# Altium schematic symbol library Minh_Lib.SchLib: 619 symbols (part 2 of 4) (continued)
## CDRH104RNP-180NC
designator H?  Supplier Part Number 1: 851-CDRH104RNP-180NC
Ind Power Shielded Wirewound 18uH 30% 100KHz Ferrite 2.6A Carrier T/R; Manufacturer: Sumida; Manufacturer Part Number: CDRH104RNP-180NC; Current Rating: 1.8A; DC Resistance (DCR): 84mR; Test Frequency: 1kHz; Max DC Current: 6.5A; Supplier 1: Mouser; RoHS: Yes; Category: Fixed Inductors; Stock 1: 64; Pricing 1: 1=1.78000, 10=1.64000, 50=1.64000, 100=1.15000, 1000=0.85100, 10000=0.82400 (USD); Mount: Surface Mount; Case/Package: Nonstandard; Core Material: Ferrite; Min Operating Temperature: -40°C; Max Operating Temperature: 100°C; Packaging: Tape and Reel; Tolerance: 30%; Package Quantity: 1000; Shielding: Shielded; Inductance: 18uH; Termination: SMD/SMT; Series: CDRH104; Length: 0.402inch; Width: 0.394inch; Height: 4mm; Height - Seated (Max): 0.157inch; Depth: 10.3mm; Radiation Hardening: No; Lead Free: Lead Free; RoHS Compliant: Yes; ComponentLink1URL: http://www.mouser.com/ds/2/390/CDRH104R-523434.pdf?src-supplier=Mouser; ComponentLink1Description: http://www.mouser.com/ds/2/390/CDRH104R-523434.pdf?src-supplier=Mouser; ComponentLink2URL: http://www.sumida.com/products/pdf/CDRH104R.pdf?src-supplier=Avnet; ComponentLink2Description: http://www.sumida.com/products/pdf/CDRH104R.pdf?src-supplier=Avnet; ComponentLink3URL: http://products.sumida.com/products/pdf/CDRH104R.pdf?src-supplier=Digi-Key; ComponentLink3Description: http://products.sumida.com/products/pdf/CDRH104R.pdf?src-supplier=Digi-Key
footprint CDRH104RNP (Inductor)
pins: 1, 2

## CDRH104RNP-181NC
designator H?  Supplier Part Number 1: CDRH104RNP-181NC
Ind Power Shielded Wirewound 180uH 30% 100KHz Ferrite 750mA Carrier T/R; Manufacturer: Sumida; Current Rating: 570mA; Max DC Current: 6.5A; DC Resistance (DCR): 840mR; Test Frequency: 1kHz; Supplier 1: Avnet; Manufacturer Part Number: CDRH104RNP-181NC; RoHS: Yes; Category: Fixed Inductors; Pricing 1: 1000=0.74266, 2000=0.73220, 4000=0.71128, 6000=0.69559, 8000=0.66944, 10000=0.65375, 100000=0.48800 (USD); Mount: Surface Mount; Case/Package: Nonstandard; Core Material: Ferrite; Min Operating Temperature: -40°C; Max Operating Temperature: 100°C; Packaging: Tape and Reel; Tolerance: 30%; Package Quantity: 1000; Shielding: Shielded; Inductance: 180uH; Termination: SMD/SMT; Series: CDRH104; Length: 0.402inch; Width: 10.3mm; Height: 4mm; Height - Seated (Max): 0.157inch; Depth: 10.3mm; Radiation Hardening: No; RoHS Compliant: Yes; ComponentLink1URL: http://www.sumida.com/products/pdf/CDRH104R.pdf?src-supplier=Avnet; ComponentLink1Description: http://www.sumida.com/products/pdf/CDRH104R.pdf?src-supplier=Avnet; ComponentLink2URL: http://www.sumida.com/en/products/search_advanced_pi_list.php?txtPartNo=CDRH104RNP&ProdType=CDRH104RNP&src-supplier=Mouser; ComponentLink2Description: http://www.sumida.com/en/products/search_advanced_pi_list.php?txtPartNo=CDRH104RNP&ProdType=CDRH104RNP&src-supplier=Mouser; ComponentLink3URL: http://products.sumida.com/products/pdf/CDRH104R.pdf?src-supplier=Digi-Key; ComponentLink3Description: http://products.sumida.com/products/pdf/CDRH104R.pdf?src-supplier=Digi-Key
footprint CDRH104RNP (Inductor)
pins: 1, 2

## CDRH104RNP-220NC
designator H?  Supplier Part Number 1: CDRH104RNP-220NC
FIXED IND 22UH 2.5A 73 MOHM SMD; Manufacturer: Sumida; Core Material: Ferrite; Tolerance: 30%; Shielding: Shielded; Saturation Current: 2.9A; DC Resistance (DCR): 73mR; Test Frequency: 100kHz; Supplier 1: Arrow Electronics; Manufacturer Part Number: CDRH104RNP-220NC; RoHS: Yes; Category: Fixed Inductors; Stock 1: 1000; Pricing 1: 1=1.55790, 10=1.40270, 25=1.35650, 100=1.20450, 250=1.14930, 500=1.06330, 1000=0.90670 (USD); Mount: Surface Mount; Case/Package: Nonstandard; Min Operating Temperature: -40°C; Max Operating Temperature: 100°C; Packaging: Tape and Reel; Package Quantity: 1; Current Rating: 2.5A; Inductance: 22uH; Max DC Current: 2.5A; Termination: SMD/SMT; DC Current: 2.5A; Series: CDRH104R; Rated Current-Max: 2.9A; Length: 10.5mm; Width: 10.3mm; Height: 4mm; Height - Seated (Max): 0.157inch; Depth: 10.3mm; Radiation Hardening: No; Military Standard: Not; Lead Free: Lead Free; RoHS Compliant: Yes; ComponentLink1URL: https://datasheet.ciiva.com/18168/getdatasheetpartid-353982-18168695.pdf?src-supplier=Verical; ComponentLink1Description: https://datasheet.ciiva.com/18168/getdatasheetpartid-353982-18168695.pdf?src-supplier=Verical
footprint CDRH104RNP (Inductor)
pins: 1, 2

## CDRH104RNP-221NC
designator H?  Supplier Part Number 1: 851-CDRH104RNP-221NC
INDUCTOR POWER 220UH 0.92A SMD; Manufacturer: Sumida; Manufacturer Part Number: CDRH104RNP-221NC; Core Material: Ferrite; Max DC Current: 700mA; DC Resistance (DCR): 756mR; Test Frequency: 100kHz; Tolerance: 30%; Shielding: Shielded; Saturation Current: 920mA; Supplier 1: Mouser; RoHS: Yes; Category: Fixed Inductors; Stock 1: 421; Pricing 1: 1=1.78000, 10=1.29000, 50=1.29000, 100=1.15000, 1000=0.80900, 10000=0.74700 (USD); Mount: Surface Mount; Case/Package: Nonstandard; Weight: 0.052911oz; Min Operating Temperature: -40°C; Max Operating Temperature: 100°C; Inductance: 220uH; Termination: SMD/SMT; Package Quantity: 1000; Packaging: Tape and Reel; Current Rating: 700mA; Length: 0.402inch; Width: 10.3mm; Height: 4mm; Height - Seated (Max): 0.157inch; Depth: 10.3mm; Radiation Hardening: No; ComponentLink1URL: http://www.sumida.com/products/pdf/CDRH104R.pdf?src-supplier=Avnet; ComponentLink1Description: http://www.sumida.com/products/pdf/CDRH104R.pdf?src-supplier=Avnet; ComponentLink2URL: http://www.sumida.com/products/pdf/CDRH104R.pdf?src-supplier=Mouser; ComponentLink2Description: http://www.sumida.com/products/pdf/CDRH104R.pdf?src-supplier=Mouser; ComponentLink3URL: http://products.sumida.com/products/pdf/CDRH104R.pdf?src-supplier=Digi-Key; ComponentLink3Description: http://products.sumida.com/products/pdf/CDRH104R.pdf?src-supplier=Digi-Key; ComponentLink4URL: http://www.sumida.com/products/pdf/CDRH104,104R.pdf?src-supplier=Future+Electronics; ComponentLink4Description: http://www.sumida.com/products/pdf/CDRH104,104R.pdf?src-supplier=Future+Electronics; ComponentLink5URL: http://www.sumida.com/products/pdf/CDRH104,104R.pdf?src-supplier=Digi-Key; ComponentLink5Description: http://www.sumida.com/products/pdf/CDRH104,104R.pdf?src-supplier=Digi-Key
footprint CDRH104RNP (Inductor)
pins: 1, 2

## CDRH104RNP-270NC
designator H?  Supplier Part Number 1: 851-CDRH104RNP-270NC
Ind Power Shielded Wirewound 27uH 30% 100KHz Ferrite 2.3A Carrier T/R; Manufacturer: Sumida; Manufacturer Part Number: CDRH104RNP-270NC; Current Rating: 1.45A; DC Resistance (DCR): 110mR; Test Frequency: 1kHz; Supplier 1: Mouser; RoHS: Yes; Category: Fixed Inductors; Stock 1: 923; Pricing 1: 1=1.78000, 10=1.64000, 50=1.64000, 100=1.15000, 1000=0.85100, 10000=0.82000 (USD); Mount: Surface Mount; Case/Package: Nonstandard; Core Material: Ferrite; Weight: 0.052911oz; Min Operating Temperature: -40°C; Max Operating Temperature: 100°C; Packaging: Tape and Reel; Tolerance: 30%; Shielding: Shielded; Inductance: 27uH; Max DC Current: 2.3A; Termination: SMD/SMT; Series: CDRH104; Length: 0.402inch; Width: 10.3mm; Height: 4mm; Height - Seated (Max): 0.157inch; Depth: 10.3mm; Radiation Hardening: No; RoHS Compliant: Yes; ComponentLink1URL: http://www.mouser.com/ds/2/390/CDRH104R-523434.pdf?src-supplier=Mouser; ComponentLink1Description: http://www.mouser.com/ds/2/390/CDRH104R-523434.pdf?src-supplier=Mouser; ComponentLink2URL: http://products.sumida.com/products/pdf/CDRH104R.pdf?src-supplier=Digi-Key; ComponentLink2Description: http://products.sumida.com/products/pdf/CDRH104R.pdf?src-supplier=Digi-Key; ComponentLink3URL: http://www.sumida.com/products/pdf/CDRH104R.pdf?src-supplier=Avnet; ComponentLink3Description: http://www.sumida.com/products/pdf/CDRH104R.pdf?src-supplier=Avnet
footprint CDRH104RNP (Inductor)
pins: 1, 2

## CDRH104RNP-271NC
designator H?  Supplier Part Number 1: 1019486
Fixed Inductors 270uH 0.84A 0.632ohm; Manufacturer: Sumida; Manufacturer Part Number: CDRH104RNP-271NC; Core Material: Ferrite; Tolerance: 30%; Shielding: Shielded; Current Rating: 470mA; DC Resistance (DCR): 1.07R; Test Frequency: 1kHz; Max DC Current: 550mA; Rated Current-Max: 840mA; Supplier 1: Future Electronics; RoHS: Yes; Category: Fixed Inductors; Stock 1: 10; Pricing 1: 1=1.24000, 10=1.17000, 40=1.13000, 150=1.09000, 500=1.03000 (USD); Mount: Surface Mount; Case/Package: Nonstandard; Weight: 0.052911oz; Min Operating Temperature: -40°C; Max Operating Temperature: 100°C; Packaging: Tape and Reel; Inductance: 270uH; Termination: SMD/SMT; Series: CDRH104; Length: 0.402inch; Width: 0.394inch; Height: 4mm; Height - Seated (Max): 0.157inch; Depth: 10.3mm; Radiation Hardening: No; Lead Free: Lead Free; RoHS Compliant: Yes; ComponentLink1URL: http://www.mouser.com/ds/2/390/CDRH104R-523434.pdf?src-supplier=Mouser; ComponentLink1Description: http://www.mouser.com/ds/2/390/CDRH104R-523434.pdf?src-supplier=Mouser; ComponentLink2URL: http://www.sumida.com/products/pdf/CDRH104,104R.pdf?src-supplier=Future+Electronics; ComponentLink2Description: http://www.sumida.com/products/pdf/CDRH104,104R.pdf?src-supplier=Future+Electronics; ComponentLink3URL: http://products.sumida.com/products/pdf/CDRH104R.pdf?src-supplier=Digi-Key; ComponentLink3Description: http://products.sumida.com/products/pdf/CDRH104R.pdf?src-supplier=Digi-Key; ComponentLink4URL: http://www.sumida.com/products/pdf/CDRH104R.pdf?src-supplier=Avnet; ComponentLink4Description: http://www.sumida.com/products/pdf/CDRH104R.pdf?src-supplier=Avnet
footprint CDRH104RNP (Inductor)
pins: 1, 2

## CDRH104RNP-330NC
designator H?  Supplier Part Number 1: 308-1433-1-ND
Ind Power Shielded Wirewound 33uH 30% 100KHz Ferrite 2.2A Carrier T/R; Manufacturer: Sumida; Manufacturer Part Number: CDRH104RNP-330NC; Saturation Current: 2.3A; DC Resistance (DCR): 93mR; Supplier 1: Digi-Key; RoHS: Yes; Category: Fixed Inductors; Stock 1: 13638; Pricing 1: 1=1.78000, 10=1.64700, 25=1.51000, 50=1.29060, 100=1.15320, 250=0.98848, 500=0.93356 (USD); Mount: Surface Mount; Case/Package: Nonstandard; Core Material: Ferrite; Min Operating Temperature: -40°C; Max Operating Temperature: 100°C; Package Quantity: 1; Current Rating: 2.2A; Tolerance: 30%; Shielding: Shielded; Packaging: Tape and Reel; Inductance: 33uH; Test Frequency: 100kHz; Max DC Current: 2.2A; Termination: SMD/SMT; DC Current: 2.2A; Length: 10.5mm; Width: 0.394inch; Height: 4mm; Height - Seated (Max): 0.157inch; Depth: 10.3mm; Radiation Hardening: No; Lead Free: Lead Free; Military Standard: Not; ComponentLink1URL: https://www.verical.com/server-webapp/html/getDatasheet?partID=358318&src-supplier=Verical; ComponentLink1Description: https://www.verical.com/server-webapp/html/getDatasheet?partID=358318&src-supplier=Verical; ComponentLink2URL: http://components.arrow.com/part/dataview/48402876S8961740N4456?src-supplier=Arrow+Electronics; ComponentLink2Description: http://components.arrow.com/part/dataview/48402876S8961740N4456?src-supplier=Arrow+Electronics; ComponentLink3URL: http://products.sumida.com/products/pdf/CDRH104R.pdf?src-supplier=Digi-Key; ComponentLink3Description: http://products.sumida.com/products/pdf/CDRH104R.pdf?src-supplier=Digi-Key; ComponentLink4URL: http://www.sumida.com/products/pdf/CDRH104,104R.pdf?src-supplier=Future+Electronics; ComponentLink4Description: http://www.sumida.com/products/pdf/CDRH104,104R.pdf?src-supplier=Future+Electronics; ComponentLink5URL: http://www.sumida.com/products/pdf/CDRH104R.pdf?src-supplier=Mouser; ComponentLink5Description: http://www.sumida.com/products/pdf/CDRH104R.pdf?src-supplier=Mouser; ComponentLink6URL: http://www.sumida.com/products/pdf/CDRH104R.pdf?src-supplier=Avnet; ComponentLink6Description: http://www.sumida.com/products/pdf/CDRH104R.pdf?src-supplier=Avnet
footprint CDRH104RNP (Inductor)
pins: 1, 2

## CDRH104RNP-331NC
designator H?  Supplier Part Number 1: 308-2169-1-ND
INDUCTOR POWER 330UH 0.70A SMD; Manufacturer: Sumida; Manufacturer Part Number: CDRH104RNP-331NC; Core Material: Ferrite; Saturation Current: 700mA; Tolerance: 30%; Shielding: Shielded; Current Rating: 520mA; DC Resistance (DCR): 1.09R; Test Frequency: 100kHz; Supplier 1: Digi-Key; RoHS: Yes; Category: Fixed Inductors; Stock 1: 84; Pricing 1: 1=1.78000, 10=1.64700, 25=1.51000, 50=1.29060, 100=1.15320, 250=0.98848, 500=0.93356 (USD); Mount: Surface Mount; Case/Package: Nonstandard; Min Operating Temperature: -40°C; Max Operating Temperature: 100°C; Packaging: Tape and Reel; Package Quantity: 1000; Inductance: 330uH; Max DC Current: 520mA; Termination: SMD/SMT; Series: CDRH; Rated Current-Max: 700mA; Length: 0.402inch; Width: 0.405inch; Height: 4mm; Height - Seated (Max): 0.157inch; Depth: 10.3mm; Radiation Hardening: No; Lead Free: Lead Free; RoHS Compliant: Yes; ComponentLink1URL: http://www.sumida.com/products/pdf/CDRH104,104R.pdf?src-supplier=Digi-Key; ComponentLink1Description: http://www.sumida.com/products/pdf/CDRH104,104R.pdf?src-supplier=Digi-Key; ComponentLink2URL: http://products.sumida.com/products/pdf/CDRH104R.pdf?src-supplier=Digi-Key; ComponentLink2Description: http://products.sumida.com/products/pdf/CDRH104R.pdf?src-supplier=Digi-Key; ComponentLink3URL: http://www.sumida.com/products/pdf/CDRH104R.pdf?src-supplier=Mouser; ComponentLink3Description: http://www.sumida.com/products/pdf/CDRH104R.pdf?src-supplier=Mouser; ComponentLink4URL: http://www.sumida.com/products/pdf/CDRH104R.pdf?src-supplier=Avnet; ComponentLink4Description: http://www.sumida.com/products/pdf/CDRH104R.pdf?src-supplier=Avnet; ComponentLink5URL: http://www.sumida.com/products/pdf/CDRH104,104R.pdf?src-supplier=Future+Electronics; ComponentLink5Description: http://www.sumida.com/products/pdf/CDRH104,104R.pdf?src-supplier=Future+Electronics
footprint CDRH104RNP (Inductor)
pins: 1, 2

## CDRH104RNP-390NC
designator H?  Supplier Part Number 1: 851-CDRH104RNP-390NC
Fixed Inductors 39uH 2.2A 0.094ohms; Manufacturer: Sumida; Manufacturer Part Number: CDRH104RNP-390NC; Core Material: Ferrite; Tolerance: 30%; Shielding: Shielded; Current Rating: 1.2A; Max DC Current: 6.5A; DC Resistance (DCR): 170mR; Test Frequency: 1kHz; Supplier 1: Mouser; RoHS: Yes; Category: Fixed Inductors; Stock 1: 795; Pricing 1: 1=1.78000, 10=1.64000, 50=1.64000, 100=1.15000, 1000=0.85100, 10000=0.82000 (USD); Mount: Surface Mount; Case/Package: Nonstandard; Min Operating Temperature: -40°C; Max Operating Temperature: 100°C; Packaging: Tape and Reel; Package Quantity: 1000; Inductance: 39uH; Termination: SMD/SMT; Series: CDRH104; Length: 0.402inch; Width: 10.3mm; Height: 4mm; Height - Seated (Max): 0.157inch; Depth: 10.3mm; Radiation Hardening: No; RoHS Compliant: Yes; ComponentLink1URL: http://www.mouser.com/ds/2/390/CDRH104R-523434.pdf?src-supplier=Mouser; ComponentLink1Description: http://www.mouser.com/ds/2/390/CDRH104R-523434.pdf?src-supplier=Mouser; ComponentLink2URL: http://www.sumida.com/products/pdf/CDRH104R.pdf?src-supplier=Avnet; ComponentLink2Description: http://www.sumida.com/products/pdf/CDRH104R.pdf?src-supplier=Avnet; ComponentLink3URL: http://products.sumida.com/products/pdf/CDRH104R.pdf?src-supplier=Digi-Key; ComponentLink3Description: http://products.sumida.com/products/pdf/CDRH104R.pdf?src-supplier=Digi-Key
footprint CDRH104RNP (Inductor)
pins: 1, 2

## CDRH104RNP-470NC
designator H?  Supplier Part Number 1: 308-1435-1-ND
Inductor Power Shielded Drum Core 47uH 30% 100KHz Ferrite 1.9A 128mOhm DCR Carrier T/R; Manufacturer: Sumida; Manufacturer Part Number: CDRH104RNP-470NC; Saturation Current: 2.1A; DC Resistance (DCR): 128mR; Supplier 1: Digi-Key; RoHS: Yes; Category: Fixed Inductors; Stock 1: 181161; Pricing 1: 1=1.78000, 10=1.64700, 25=1.51000, 50=1.29060, 100=1.15320, 250=0.98848, 500=0.93356 (USD); Mount: Surface Mount; Case/Package: Nonstandard; Core Material: Ferrite; Weight: 0.052911oz; Min Operating Temperature: -40°C; Max Operating Temperature: 100°C; Tolerance: 30%; Shielding: Shielded; Package Quantity: 1; Current Rating: 1.9A; Packaging: Tape and Reel; Inductance: 47uH; Test Frequency: 100kHz; Max DC Current: 1.9A; Termination: SMD/SMT; DC Current: 1.9A; Length: 10.5mm; Width: 0.394inch; Height: 4mm; Height - Seated (Max): 0.157inch; Depth: 10.3mm; Radiation Hardening: No; Lead Free: Lead Free; Military Standard: Not; ComponentLink1URL: http://www.mouser.com/ds/2/390/CDRH104,104R-514178.pdf?src-supplier=Mouser; ComponentLink1Description: http://www.mouser.com/ds/2/390/CDRH104,104R-514178.pdf?src-supplier=Mouser; ComponentLink2URL: http://components.arrow.com/part/dataview/51004602S8961745N4456?src-supplier=Arrow+Electronics; ComponentLink2Description: http://components.arrow.com/part/dataview/51004602S8961745N4456?src-supplier=Arrow+Electronics; ComponentLink3URL: http://products.sumida.com/products/pdf/CDRH104R.pdf?src-supplier=Digi-Key; ComponentLink3Description: http://products.sumida.com/products/pdf/CDRH104R.pdf?src-supplier=Digi-Key; ComponentLink4URL: https://www.verical.com/server-webapp/html/getDatasheet?partID=353983&src-supplier=Verical; ComponentLink4Description: https://www.verical.com/server-webapp/html/getDatasheet?partID=353983&src-supplier=Verical; ComponentLink5URL: http://www.sumida.com/products/pdf/CDRH104,104R.pdf?src-supplier=Future+Electronics; ComponentLink5Description: http://www.sumida.com/products/pdf/CDRH104,104R.pdf?src-supplier=Future+Electronics; ComponentLink6URL: http://www.sumida.com/products/pdf/CDRH104R.pdf?src-supplier=Avnet; ComponentLink6Description: http://www.sumida.com/products/pdf/CDRH104R.pdf?src-supplier=Avnet
footprint CDRH104RNP (Inductor)
pins: 1, 2

## CDRH104RNP-560NC
designator H?  Supplier Part Number 1: CDRH104RNP-560NC
Fixed Inductors 56uH 1.65A 0.139ohms; Manufacturer: Sumida; Core Material: Ferrite; Tolerance: 30%; Shielding: Shielded; Current Rating: 1A; Max DC Current: 6.5A; DC Resistance (DCR): 230mR; Test Frequency: 1kHz; Supplier 1: Avnet; Manufacturer Part Number: CDRH104RNP-560NC; RoHS: Yes; Category: Fixed Inductors; Pricing 1: 1000=0.74266, 2000=0.73220, 4000=0.71128, 6000=0.69559, 8000=0.66944, 10000=0.65375, 100000=0.48800 (USD); Mount: Surface Mount; Case/Package: Nonstandard; Min Operating Temperature: -40°C; Max Operating Temperature: 100°C; Package Quantity: 1000; Packaging: Tape and Reel; Inductance: 56uH; Termination: SMD/SMT; Series: CDRH104; Length: 0.402inch; Width: 10.3mm; Height: 4mm; Height - Seated (Max): 0.157inch; Depth: 10.3mm; Radiation Hardening: No; RoHS Compliant: Yes; ComponentLink1URL: http://www.sumida.com/en/products/search_advanced_pi_list.php?txtPartNo=CDRH104RNP&ProdType=CDRH104RNP&src-supplier=Mouser; ComponentLink1Description: http://www.sumida.com/en/products/search_advanced_pi_list.php?txtPartNo=CDRH104RNP&ProdType=CDRH104RNP&src-supplier=Mouser; ComponentLink2URL: http://www.sumida.com/products/pdf/CDRH104R.pdf?src-supplier=Avnet; ComponentLink2Description: http://www.sumida.com/products/pdf/CDRH104R.pdf?src-supplier=Avnet; ComponentLink3URL: http://products.sumida.com/products/pdf/CDRH104R.pdf?src-supplier=Digi-Key; ComponentLink3Description: http://products.sumida.com/products/pdf/CDRH104R.pdf?src-supplier=Digi-Key
footprint CDRH104RNP (Inductor)
pins: 1, 2

## CDRH104RNP-680NC
designator H?  Supplier Part Number 1: 308-2170-1-ND
Ind Power Shielded Wirewound 68uH 30% 100KHz Ferrite 1.42A Carrier T/R; Manufacturer: Sumida; Manufacturer Part Number: CDRH104RNP-680NC; Saturation Current: 1.5A; DC Resistance (DCR): 213mR; Supplier 1: Digi-Key; RoHS: Yes; Category: Fixed Inductors; Stock 1: 26557; Pricing 1: 1=1.78000, 10=1.64700, 25=1.51000, 50=1.29060, 100=1.15320, 250=0.98848, 500=0.93356 (USD); Mount: Surface Mount; Case/Package: Nonstandard; Core Material: Ferrite; Min Operating Temperature: -40°C; Max Operating Temperature: 100°C; Package Quantity: 1000; Current Rating: 1.42A; Tolerance: 30%; Shielding: Shielded; Packaging: Tape and Reel; Inductance: 68uH; Test Frequency: 100kHz; Max DC Current: 1.42A; Termination: SMD/SMT; Series: CDRH; Rated Current-Max: 1.5A; Length: 0.402inch; Width: 0.405inch; Height: 4mm; Height - Seated (Max): 0.157inch; Depth: 10.3mm; Radiation Hardening: No; Lead Free: Lead Free; RoHS Compliant: Yes; ComponentLink1URL: http://www.sumida.com/products/pdf/CDRH104,104R.pdf?src-supplier=Digi-Key; ComponentLink1Description: http://www.sumida.com/products/pdf/CDRH104,104R.pdf?src-supplier=Digi-Key; ComponentLink2URL: http://products.sumida.com/products/pdf/CDRH104R.pdf?src-supplier=Digi-Key; ComponentLink2Description: http://products.sumida.com/products/pdf/CDRH104R.pdf?src-supplier=Digi-Key; ComponentLink3URL: http://www.sumida.com/products/pdf/CDRH104,104R.pdf?src-supplier=Mouser; ComponentLink3Description: http://www.sumida.com/products/pdf/CDRH104,104R.pdf?src-supplier=Mouser; ComponentLink4URL: http://www.sumida.com/products/pdf/CDRH104R.pdf?src-supplier=Avnet; ComponentLink4Description: http://www.sumida.com/products/pdf/CDRH104R.pdf?src-supplier=Avnet; ComponentLink5URL: http://www.sumida.com/products/pdf/CDRH104,104R.pdf?src-supplier=Future+Electronics; ComponentLink5Description: http://www.sumida.com/products/pdf/CDRH104,104R.pdf?src-supplier=Future+Electronics
footprint CDRH104RNP (Inductor)
pins: 1, 2

## CDRH104RNP-820NC
designator H?  Supplier Part Number 1: 308-1918-1-ND
Fixed Inductors 82uH 1.45A 0.218ohms; Manufacturer: Sumida; Manufacturer Part Number: CDRH104RNP-820NC; Core Material: Ferrite; Tolerance: 30%; Shielding: Shielded; Current Rating: 1.3A; DC Resistance (DCR): 283mR; Test Frequency: 100kHz; Max DC Current: 6.5A; Supplier 1: Digi-Key; RoHS: Yes; Category: Fixed Inductors; Stock 1: 7; Pricing 1: 1=1.70000 (USD); Mount: Surface Mount; Case/Package: Nonstandard; Min Operating Temperature: -40°C; Max Operating Temperature: 100°C; Packaging: Tape and Reel; Package Quantity: 1000; Saturation Current: 1.45A; Inductance: 82uH; Termination: SMD/SMT; Series: CDRH104R; Length: 0.402inch; Width: 0.394inch; Height: 4mm; Height - Seated (Max): 0.157inch; Depth: 10.3mm; Radiation Hardening: No; Lead Free: Lead Free; RoHS Compliant: Yes; ComponentLink1URL: http://www.mouser.com/ds/2/390/CDRH104R-523434.pdf?src-supplier=Mouser; ComponentLink1Description: http://www.mouser.com/ds/2/390/CDRH104R-523434.pdf?src-supplier=Mouser; ComponentLink2URL: http://products.sumida.com/products/pdf/CDRH104R.pdf?src-supplier=Digi-Key; ComponentLink2Description: http://products.sumida.com/products/pdf/CDRH104R.pdf?src-supplier=Digi-Key; ComponentLink3URL: http://www.sumida.com/products/pdf/CDRH104R.pdf?src-supplier=Avnet; ComponentLink3Description: http://www.sumida.com/products/pdf/CDRH104R.pdf?src-supplier=Avnet
footprint CDRH104RNP (Inductor)
pins: 1, 2

## CDRH127NP-1R2NC
designator H?  Supplier Part Number 1: 4059232
Ind Power Shielded Wirewound 1.2uH -20% to 40% 100KHz Ferrite 9.8A Carrier T/R; Manufacturer: Sumida; Manufacturer Part Number: CDRH127NP-1R2NC; DC Resistance (DCR): 7mR; Supplier 1: Future Electronics; RoHS: Yes; Category: Fixed Inductors; Stock 1: 5000; Pricing 1: 500=0.30000, 1500=0.29000, 2000=0.28500, 5000=0.28000, 7500=0.27000 (USD); Mount: Surface Mount; Case/Package: Nonstandard; Core Material: Ferrite; Weight: 0.126986oz; Min Operating Temperature: -40°C; Max Operating Temperature: 100°C; Packaging: Tape and Reel; Tolerance: 40%; Package Quantity: 500; Shielding: Shielded; Current Rating: 9.8A; Inductance: 1.2uH; Max DC Current: 9.8A; Termination: SMD/SMT; Test Frequency: 100kHz; Series: CDRH127; Length: 12.3mm; Width: 12.3mm; Height: 8mm; Height - Seated (Max): 0.315inch; Depth: 12.3mm; Radiation Hardening: No; Lead Free: Lead Free; RoHS Compliant: Yes; ComponentLink1URL: http://www.sumida.com/products/pdf/CDRH127.pdf?src-supplier=Avnet; ComponentLink1Description: http://www.sumida.com/products/pdf/CDRH127.pdf?src-supplier=Avnet; ComponentLink2URL: http://www.sumida.com/products/pdf/CDRH127.pdf?src-supplier=Mouser; ComponentLink2Description: http://www.sumida.com/products/pdf/CDRH127.pdf?src-supplier=Mouser; ComponentLink3URL: http://products.sumida.com/products/pdf/CDRH127.pdf?src-supplier=Digi-Key; ComponentLink3Description: http://products.sumida.com/products/pdf/CDRH127.pdf?src-supplier=Digi-Key
footprint CDRH127NP (Inductor)
pins: 1, 2

## CDRH127NP-2R4NC
designator H?  Supplier Part Number 1: 851-CDRH127NP-2R4NC
FIXED IND 2.4UH 8A 11.5 MOHM SMD; Manufacturer: Sumida; Manufacturer Part Number: CDRH127NP-2R4NC; Core Material: Ferrite; Tolerance: 40%; Shielding: Shielded; DC Resistance (DCR): 11.5mR; Test Frequency: 100kHz; Supplier 1: Mouser; RoHS: Yes; Category: Fixed Inductors; Stock 1: 317; Pricing 1: 1=2.10000, 10=1.93000, 50=1.93000, 100=1.35000, 500=1.05000, 1000=0.99000, 2500=0.98500, 5000=0.97200, 10000=0.95400, 25000=0.91600 (USD); Mount: Surface Mount; Case/Package: Nonstandard; Weight: 0.126986oz; Min Operating Temperature: -40°C; Max Operating Temperature: 100°C; Package Quantity: 500; Packaging: Tape and Reel; Current Rating: 8A; Inductance: 2.4uH; Max DC Current: 8A; Termination: SMD/SMT; Series: CDRH127; Rated Current-Max: 8A; Length: 0.472inch; Width: 12.3mm; Height: 8mm; Height - Seated (Max): 0.315inch; Depth: 12.3mm; Radiation Hardening: No; Lead Free: Lead Free; RoHS Compliant: Yes; ComponentLink1URL: http://www.sumida.com/products/pdf/CDRH127.pdf?src-supplier=Mouser; ComponentLink1Description: http://www.sumida.com/products/pdf/CDRH127.pdf?src-supplier=Mouser; ComponentLink2URL: http://products.sumida.com/products/pdf/CDRH127.pdf?src-supplier=Digi-Key; ComponentLink2Description: http://products.sumida.com/products/pdf/CDRH127.pdf?src-supplier=Digi-Key; ComponentLink3URL: http://www.sumida.com/products/pdf/CDRH127,127LD.pdf?src-supplier=Future+Electronics; ComponentLink3Description: http://www.sumida.com/products/pdf/CDRH127,127LD.pdf?src-supplier=Future+Electronics; ComponentLink4URL: http://www.sumida.com/products/pdf/CDRH127.pdf?src-supplier=Avnet; ComponentLink4Description: http://www.sumida.com/products/pdf/CDRH127.pdf?src-supplier=Avnet
footprint CDRH127NP (Inductor)
pins: 1, 2

## CDRH127NP-3R5NC
designator H?  Supplier Part Number 1: 308-1470-1-ND
Ind Power Shielded Wirewound 3.5uH -20% to 40% 100KHz Ferrite 7.5A Carrier T/R; Manufacturer: Sumida; Manufacturer Part Number: CDRH127NP-3R5NC; DC Resistance (DCR): 13.5mR; Supplier 1: Digi-Key; RoHS: Yes; Category: Fixed Inductors; Stock 1: 5323; Pricing 1: 1=2.10000, 10=1.93400, 25=1.77280, 50=1.51500, 100=1.35390, 250=1.16048 (USD); Mount: Surface Mount; Case/Package: Nonstandard; Core Material: Ferrite; Weight: 0.126986oz; Min Operating Temperature: -40°C; Max Operating Temperature: 100°C; Package Quantity: 500; Current Rating: 7.5A; Tolerance: 40%; Shielding: Shielded; Packaging: Tape and Reel; Inductance: 3.5uH; Test Frequency: 100kHz; Max DC Current: 7.5A; Termination: SMD/SMT; DC Current: 7.5A; Series: CDRH127; Rated Current-Max: 7.5A; Length: 12.3mm; Width: 0.472inch; Height: 8mm; Height - Seated (Max): 0.315inch; Depth: 12.3mm; Radiation Hardening: No; Military Standard: Not; Lead Free: Lead Free; RoHS Compliant: Yes; ComponentLink1URL: https://www.verical.com/server-webapp/html/getDatasheet?partID=357363&src-supplier=Verical; ComponentLink1Description: https://www.verical.com/server-webapp/html/getDatasheet?partID=357363&src-supplier=Verical; ComponentLink2URL: http://components.arrow.com/part/dataview/48446630S8961788N4456?src-supplier=Arrow+Electronics; ComponentLink2Description: http://components.arrow.com/part/dataview/48446630S8961788N4456?src-supplier=Arrow+Electronics; ComponentLink3URL: http://products.sumida.com/products/pdf/CDRH127.pdf?src-supplier=Digi-Key; ComponentLink3Description: http://products.sumida.com/products/pdf/CDRH127.pdf?src-supplier=Digi-Key; ComponentLink4URL: http://www.sumida.com/products/pdf/CDRH127.pdf?src-supplier=Mouser; ComponentLink4Description: http://www.sumida.com/products/pdf/CDRH127.pdf?src-supplier=Mouser; ComponentLink5URL: http://www.sumida.com/products/pdf/CDRH127,127LD.pdf?src-supplier=Future+Electronics; ComponentLink5Description: http://www.sumida.com/products/pdf/CDRH127,127LD.pdf?src-supplier=Future+Electronics; ComponentLink6URL: http://www.sumida.com/products/pdf/CDRH127.pdf?src-supplier=Avnet; ComponentLink6Description: http://www.sumida.com/products/pdf/CDRH127.pdf?src-supplier=Avnet
footprint CDRH127NP (Inductor)
pins: 1, 2

## CDRH127NP-4R7NC
designator H?  Supplier Part Number 1: 8790560
Ind Power Shielded Wirewound 4.7uH -20% to 40% 100KHz Ferrite 6.8A Carrier T/R; Manufacturer: Sumida; Manufacturer Part Number: CDRH127NP-4R7NC; DC Resistance (DCR): 15.8mR; Supplier 1: Future Electronics; RoHS: Yes; Category: Fixed Inductors; Stock 1: 166; Pricing 1: 1=2.24000, 5=2.09000, 30=1.92000, 100=1.81000, 250=1.72000 (USD); Mount: Surface Mount; Case/Package: Nonstandard; Core Material: Ferrite; Weight: 0.126986oz; Min Operating Temperature: -40°C; Max Operating Temperature: 100°C; Current Rating: 6.8A; Tolerance: 40%; Shielding: Shielded; Packaging: Tape and Reel; Package Quantity: 1; Inductance: 4.7uH; Test Frequency: 100kHz; Max DC Current: 6.8A; Termination: SMD/SMT; DC Current: 6.8A; Series: CDRH127; Rated Current-Max: 6.8A; Length: 12.3mm; Width: 0.472inch; Height: 8mm; Height - Seated (Max): 0.315inch; Depth: 12.3mm; Radiation Hardening: No; Military Standard: Not; Lead Free: Lead Free; RoHS Compliant: Yes; ComponentLink1URL: https://datasheet.ciiva.com/26875/getdatasheetpartid-358338-26875217.pdf?src-supplier=Verical; ComponentLink1Description: https://datasheet.ciiva.com/26875/getdatasheetpartid-358338-26875217.pdf?src-supplier=Verical
footprint CDRH127NP (Inductor)
pins: 1, 2

## CDRH127NP-6R1NC
designator H?  Supplier Part Number 1: 308-1476-1-ND
Ind Power Shielded Wirewound 6.1uH -20% to 40% 100KHz Ferrite 6.6A Carrier T/R; Manufacturer: Sumida; Manufacturer Part Number: CDRH127NP-6R1NC; DC Resistance (DCR): 17.6mR; Supplier 1: Digi-Key; RoHS: Yes; Category: Fixed Inductors; Stock 1: 6755; Pricing 1: 1=2.10000, 10=1.93400, 25=1.77280, 50=1.51500, 100=1.35390, 250=1.16048 (USD); Mount: Surface Mount; Case/Package: Nonstandard; Core Material: Ferrite; Weight: 0.126986oz; Min Operating Temperature: -40°C; Max Operating Temperature: 100°C; Tolerance: 40%; Shielding: Shielded; Packaging: Tape and Reel; Package Quantity: 1; Current Rating: 6.6A; Inductance: 6.1uH; Test Frequency: 100kHz; Max DC Current: 6.6A; Termination: SMD/SMT; DC Current: 6.6A; Series: CDRH127; Rated Current-Max: 6.6A; Length: 12.3mm; Width: 0.472inch; Height: 8mm; Height - Seated (Max): 0.315inch; Depth: 12.3mm; Radiation Hardening: No; Military Standard: Not; Lead Free: Lead Free; RoHS Compliant: Yes; ComponentLink1URL: https://www.verical.com/server-webapp/html/getDatasheet?partID=355129&src-supplier=Verical; ComponentLink1Description: https://www.verical.com/server-webapp/html/getDatasheet?partID=355129&src-supplier=Verical; ComponentLink2URL: http://components.arrow.com/part/dataview/51004628S8883455N4456?src-supplier=Arrow+Electronics; ComponentLink2Description: http://components.arrow.com/part/dataview/51004628S8883455N4456?src-supplier=Arrow+Electronics; ComponentLink3URL: http://products.sumida.com/products/pdf/CDRH127.pdf?src-supplier=Digi-Key; ComponentLink3Description: http://products.sumida.com/products/pdf/CDRH127.pdf?src-supplier=Digi-Key; ComponentLink4URL: http://www.sumida.com/products/pdf/CDRH127,127LD.pdf?src-supplier=Future+Electronics; ComponentLink4Description: http://www.sumida.com/products/pdf/CDRH127,127LD.pdf?src-supplier=Future+Electronics; ComponentLink5URL: http://www.sumida.com/products/pdf/CDRH127.pdf?src-supplier=Avnet; ComponentLink5Description: http://www.sumida.com/products/pdf/CDRH127.pdf?src-supplier=Avnet; ComponentLink6URL: http://www.sumida.com/products/pdf/CDRH127.pdf?src-supplier=Mouser; ComponentLink6Description: http://www.sumida.com/products/pdf/CDRH127.pdf?src-supplier=Mouser
footprint CDRH127NP (Inductor)
pins: 1, 2

## CDRH127NP-7R6NC
designator H?  Supplier Part Number 1: 851-CDRH127NP-7R6NC
Ind Power Shielded Wirewound 7.6uH -20% to 40% 100KHz Ferrite 5.9A Carrier T/R; Manufacturer: Sumida; Manufacturer Part Number: CDRH127NP-7R6NC; DC Resistance (DCR): 20mR; Supplier 1: Mouser; RoHS: Yes; Category: Fixed Inductors; Stock 1: 440; Pricing 1: 1=2.10000, 10=1.93000, 50=1.93000, 100=1.35000, 1000=0.99000, 10000=0.99000 (USD); Mount: Surface Mount; Case/Package: Nonstandard; Core Material: Ferrite; Weight: 0.126986oz; Min Operating Temperature: -40°C; Max Operating Temperature: 100°C; Tolerance: 40%; Shielding: Shielded; Package Quantity: 1; Packaging: Tape and Reel; Current Rating: 5.9A; Inductance: 7.6uH; Max DC Current: 5.9A; Termination: SMD/SMT; Test Frequency: 100kHz; DC Current: 5.9A; Length: 12.3mm; Width: 12.3mm; Height: 8mm; Height - Seated (Max): 0.315inch; Depth: 12.3mm; Radiation Hardening: No; Military Standard: Not; Lead Free: Lead Free; ComponentLink1URL: https://www.verical.com/server-webapp/html/getDatasheet?partID=355322&src-supplier=Verical; ComponentLink1Description: https://www.verical.com/server-webapp/html/getDatasheet?partID=355322&src-supplier=Verical; ComponentLink2URL: http://components.arrow.com/part/dataview/51202923S9072161N4456?src-supplier=Arrow+Electronics; ComponentLink2Description: http://components.arrow.com/part/dataview/51202923S9072161N4456?src-supplier=Arrow+Electronics; ComponentLink3URL: http://www.sumida.com/products/pdf/CDRH127.pdf?src-supplier=Mouser; ComponentLink3Description: http://www.sumida.com/products/pdf/CDRH127.pdf?src-supplier=Mouser; ComponentLink4URL: http://www.sumida.com/products/pdf/CDRH127,127LD.pdf?src-supplier=Future+Electronics; ComponentLink4Description: http://www.sumida.com/products/pdf/CDRH127,127LD.pdf?src-supplier=Future+Electronics; ComponentLink5URL: http://www.sumida.com/products/pdf/CDRH127.pdf?src-supplier=Avnet; ComponentLink5Description: http://www.sumida.com/products/pdf/CDRH127.pdf?src-supplier=Avnet; ComponentLink6URL: http://products.sumida.com/products/pdf/CDRH127.pdf?src-supplier=Digi-Key; ComponentLink6Description: http://products.sumida.com/products/pdf/CDRH127.pdf?src-supplier=Digi-Key
footprint CDRH127NP (Inductor)
pins: 1, 2

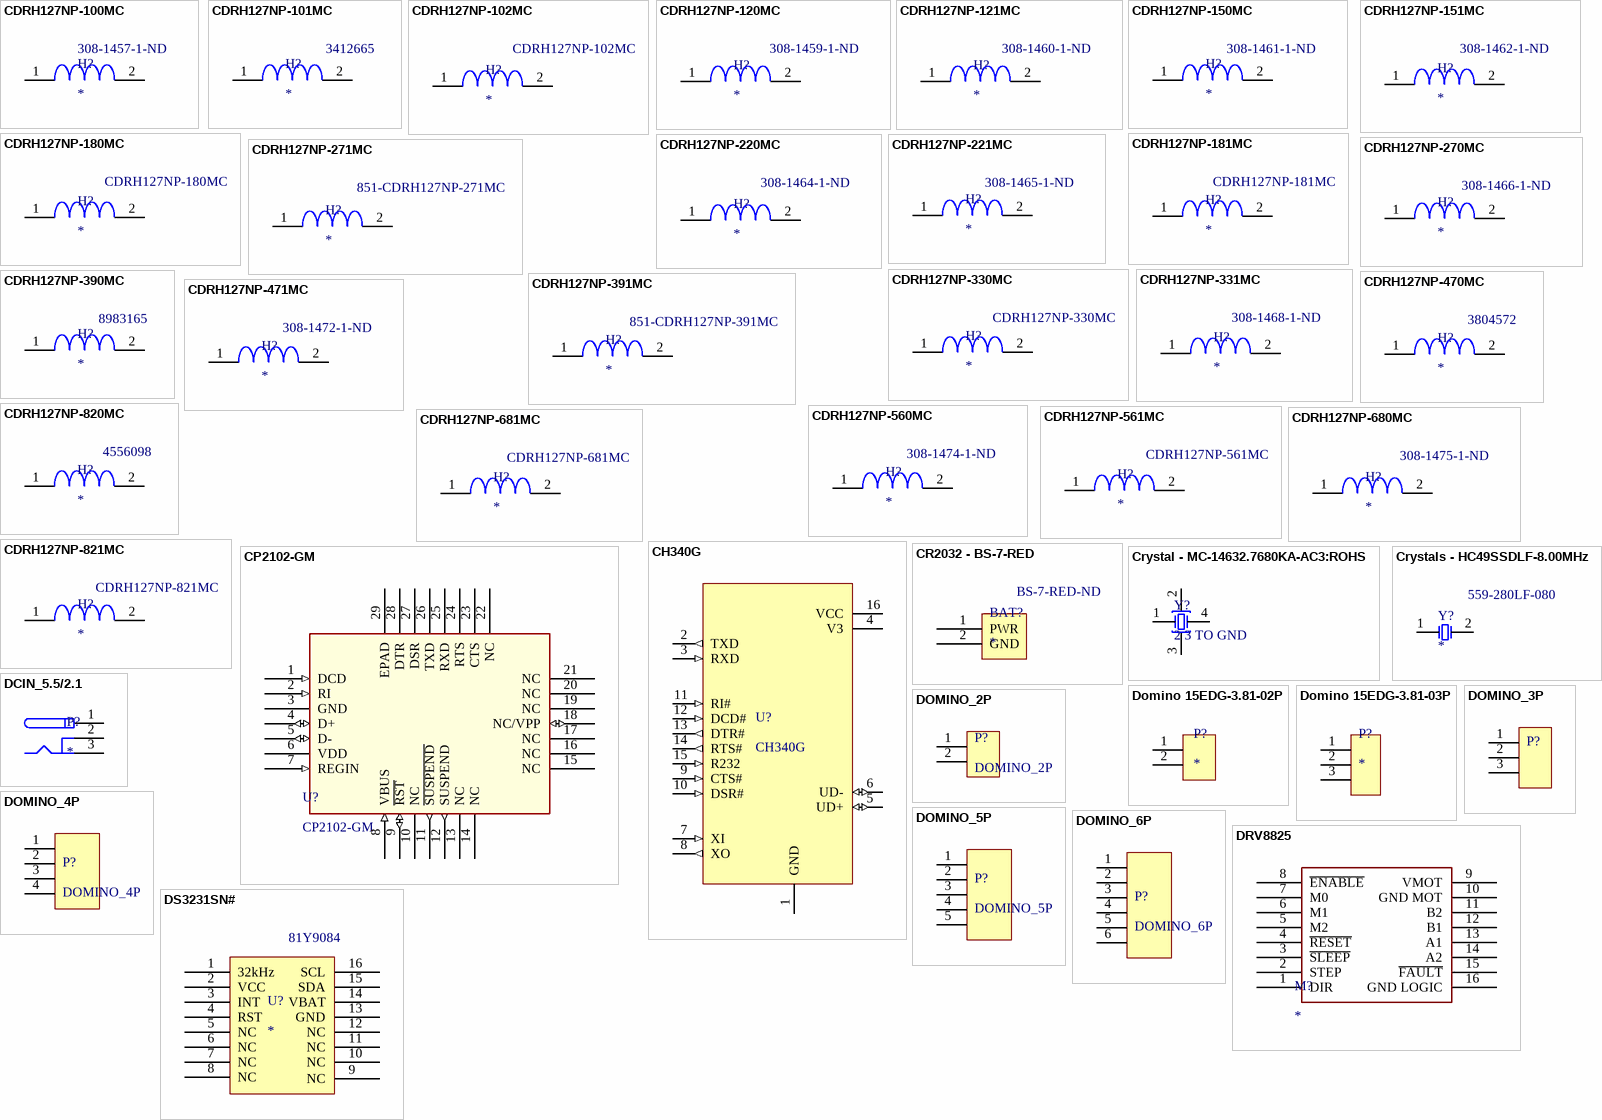
[diagram p6: symbols CDRH127NP-100MC to DS3231SN#]

## CDRH127NP-100MC
designator H?  Supplier Part Number 1: 308-1457-1-ND
Ind Power Shielded Wirewound 10uH 20% 1KHz Ferrite 5.4A Carrier T/R; Manufacturer: Sumida; Manufacturer Part Number: CDRH127NP-100MC; DC Resistance (DCR): 21.6mR; Supplier 1: Digi-Key; RoHS: Yes; Category: Fixed Inductors; Stock 1: 58688; Pricing 1: 1=2.10000, 10=1.93400, 25=1.77280, 50=1.51500, 100=1.35390, 250=1.16048 (USD); Mount: Surface Mount; Case/Package: Nonstandard; Core Material: Ferrite; Min Operating Temperature: -40°C; Max Operating Temperature: 100°C; Package Quantity: 1; Current Rating: 5.4A; Tolerance: 20%; Shielding: Shielded; Packaging: Tape and Reel; Inductance: 10uH; Test Frequency: 1kHz; Max DC Current: 5.4A; Termination: SMD/SMT; DC Current: 5.4A; Series: CDRH127; Rated Current-Max: 5.4A; Length: 12.3mm; Width: 0.472inch; Height: 8mm; Height - Seated (Max): 0.315inch; Depth: 12.3mm; Radiation Hardening: No; Military Standard: Not; Lead Free: Lead Free; RoHS Compliant: Yes; ComponentLink1URL: http://products.sumida.com/products/pdf/CDRH127.pdf?src-supplier=Digi-Key; ComponentLink1Description: http://products.sumida.com/products/pdf/CDRH127.pdf?src-supplier=Digi-Key; ComponentLink2URL: http://www.sumida.com/products/pdf/CDRH127.pdf?src-supplier=Mouser; ComponentLink2Description: http://www.sumida.com/products/pdf/CDRH127.pdf?src-supplier=Mouser; ComponentLink3URL: http://www.sumida.com/products/pdf/CDRH127.pdf?src-supplier=Avnet; ComponentLink3Description: http://www.sumida.com/products/pdf/CDRH127.pdf?src-supplier=Avnet; ComponentLink4URL: http://components.arrow.com/part/dataview/51004660S8961774N4456?src-supplier=Arrow+Electronics; ComponentLink4Description: http://components.arrow.com/part/dataview/51004660S8961774N4456?src-supplier=Arrow+Electronics; ComponentLink5URL: http://www.sumida.com/products/pdf/CDRH127,127LD.pdf?src-supplier=Future+Electronics; ComponentLink5Description: http://www.sumida.com/products/pdf/CDRH127,127LD.pdf?src-supplier=Future+Electronics; ComponentLink6URL: https://www.verical.com/server-webapp/html/getDatasheet?partID=357347&src-supplier=Verical; ComponentLink6Description: https://www.verical.com/server-webapp/html/getDatasheet?partID=357347&src-supplier=Verical
footprint CDRH127NP (Inductor)
pins: 1, 2

## CDRH127NP-101MC
designator H?  Supplier Part Number 1: 3412665
Ind Power Shielded Wirewound 100uH 20% 1KHz Ferrite 1.7A Carrier T/R; Manufacturer: Sumida; Manufacturer Part Number: CDRH127NP-101MC; DC Resistance (DCR): 220mR; Supplier 1: Future Electronics; RoHS: Yes; Category: Fixed Inductors; Stock 1: 500; Pricing 1: 500=0.59000, 1000=0.57500, 1500=0.57000, 2000=0.56500, 2500=0.54500 (USD); Mount: Surface Mount; Case/Package: Nonstandard; Core Material: Ferrite; Min Operating Temperature: -40°C; Max Operating Temperature: 100°C; Package Quantity: 1; Current Rating: 1.7A; Tolerance: 20%; Shielding: Shielded; Packaging: Tape and Reel; Inductance: 100uH; Test Frequency: 1kHz; Max DC Current: 1.7A; Termination: SMD/SMT; DC Current: 1.7A; Series: CDRH127; Rated Current-Max: 1.7A; Length: 12.3mm; Width: 0.472inch; Height: 8mm; Height - Seated (Max): 0.315inch; Depth: 12.3mm; Radiation Hardening: No; Military Standard: Not; Lead Free: Lead Free; RoHS Compliant: Yes; ComponentLink1URL: https://datasheet.ciiva.com/18168/getdatasheetpartid-358321-18168759.pdf?src-supplier=Verical; ComponentLink1Description: https://datasheet.ciiva.com/18168/getdatasheetpartid-358321-18168759.pdf?src-supplier=Verical
footprint CDRH127NP (Inductor)
pins: 1, 2

## CDRH127NP-102MC
designator H?  Supplier Part Number 1: CDRH127NP-102MC
Ind Power Shielded Wirewound 1mH 20% 1KHz Ferrite 550mA Carrier T/R; Manufacturer: Sumida; DC Resistance (DCR): 1.82R; Supplier 1: Avnet; Manufacturer Part Number: CDRH127NP-102MC; RoHS: Yes; Category: Fixed Inductors; Pricing 1: 500=0.87188, 1000=0.85960, 2000=0.83504, 3000=0.81662, 4000=0.78592, 5000=0.76750, 50000=0.61366 (USD); Mount: Surface Mount; Case/Package: Nonstandard; Core Material: Ferrite; Min Operating Temperature: -40°C; Max Operating Temperature: 100°C; Package Quantity: 500; Current Rating: 550mA; Tolerance: 20%; Shielding: Shielded; Packaging: Tape and Reel; Inductance: 1mH; Test Frequency: 1kHz; Max DC Current: 550mA; Termination: SMD/SMT; Series: CDRH; Rated Current-Max: 550mA; Length: 0.472inch; Width: 0.484inch; Height: 8mm; Height - Seated (Max): 0.315inch; Depth: 12.3mm; Radiation Hardening: No; Lead Free: Lead Free; RoHS Compliant: Yes; ComponentLink1URL: http://www.sumida.com/products/pdf/CDRH127,127LD.pdf?src-supplier=Digi-Key; ComponentLink1Description: http://www.sumida.com/products/pdf/CDRH127,127LD.pdf?src-supplier=Digi-Key; ComponentLink2URL: http://products.sumida.com/products/pdf/CDRH127.pdf?src-supplier=Digi-Key; ComponentLink2Description: http://products.sumida.com/products/pdf/CDRH127.pdf?src-supplier=Digi-Key; ComponentLink3URL: http://www.sumida.com/products/pdf/CDRH127.pdf?src-supplier=Mouser; ComponentLink3Description: http://www.sumida.com/products/pdf/CDRH127.pdf?src-supplier=Mouser; ComponentLink4URL: http://www.sumida.com/products/pdf/CDRH127.pdf?src-supplier=Avnet; ComponentLink4Description: http://www.sumida.com/products/pdf/CDRH127.pdf?src-supplier=Avnet; ComponentLink5URL: http://www.sumida.com/products/pdf/CDRH127,127LD.pdf?src-supplier=Future+Electronics; ComponentLink5Description: http://www.sumida.com/products/pdf/CDRH127,127LD.pdf?src-supplier=Future+Electronics
footprint CDRH127NP (Inductor)
pins: 1, 2
